# Altium schematic symbol library FPGA_Xilinx_Virtex7.SchLib: 34 symbols (part 2 of 34) (continued)
## XC7V585T-FFG1761 (continued)
part M pins: E5 MGTXRXN3_118 (io), E6 MGTXRXP3_118 (io), E9 MGTREFCLK0N_118 (io), E10 MGTREFCLK0P_118 (io), F3 MGTXTXN3_118 (io), F4 MGTXTXP3_118 (io), F7 MGTXRXN2_118 (io), F8 MGTXRXP2_118 (io), G1 MGTXTXN2_118 (io), G2 MGTXTXP2_118 (io), G5 MGTXRXN1_118 (io), G6 MGTXRXP1_118 (io), G9 MGTREFCLK1N_118 (io), G10 MGTREFCLK1P_118 (io), H3 MGTXTXN1_118 (io), H4 MGTXTXP1_118 (io), H7 MGTXRXN0_118 (io), H8 MGTXRXP0_118 (io), J1 MGTXTXN0_118 (io), J2 MGTXTXP0_118 (io), J5 MGTXRXN3_117 (io), J6 MGTXRXP3_117 (io), K3 MGTXTXN3_117 (io), K4 MGTXTXP3_117 (io), K7 MGTREFCLK0N_117 (io), K8 MGTREFCLK0P_117 (io), L1 MGTXTXN2_117 (io), L2 MGTXTXP2_117 (io), L5 MGTXRXN2_117 (io), L6 MGTXRXP2_117 (io), M3 MGTXTXN1_117 (io), M4 MGTXTXP1_117 (io), M7 MGTREFCLK1N_117 (io), M8 MGTREFCLK1P_117 (io), N1 MGTXTXN0_117 (io), N2 MGTXTXP0_117 (io), N5 MGTXRXN1_117 (io), N6 MGTXRXP1_117 (io), P7 MGTXRXN0_117 (io), P8 MGTXRXP0_117 (io)
part N pins: A5 MGTXRXN3_119 (io), A6 MGTXRXP3_119 (io), A9 MGTREFCLK0N_119 (io), A10 MGTREFCLK0P_119 (io), B3 MGTXTXN3_119 (io), B4 MGTXTXP3_119 (io), B7 MGTXRXN2_119 (io), B8 MGTXRXP2_119 (io), C1 MGTXTXN2_119 (io), C2 MGTXTXP2_119 (io), C5 MGTXRXN1_119 (io), C6 MGTXRXP1_119 (io), C9 MGTREFCLK1N_119 (io), C10 MGTREFCLK1P_119 (io), D3 MGTXTXN1_119 (io), D4 MGTXTXP1_119 (io), D7 MGTXRXN0_119 (io), D8 MGTXRXP0_119 (io), E1 MGTXTXN0_119 (io), E2 MGTXTXP0_119 (io)
part O pins: A12 MGTAVTTRCAL_115 (power), AA4 MGTAVTT_G10 (power), AA8 MGTAVCC_G10 (power), AC4 MGTAVTT_G10 (power), AC8 MGTAVCC_G10 (power), AE4 MGTAVTT_G10 (power), AE8 MGTAVCC_G10 (power), AJ4 MGTAVTT_G10 (power), AJ8 MGTAVCC_G10 (power), AL4 MGTAVTT_G10 (power), AL8 MGTAVCC_G10 (power), AM6 MGTAVTT_G10 (power), AN4 MGTAVTT_G10 (power), AN8 MGTAVCC_G10 (power), AP6 MGTAVTT_G10 (power), AR4 MGTAVTT_G10 (power), AR8 MGTAVCC_G10 (power), AU4 MGTAVTT_G10 (power), AU8 MGTAVCC_G10 (power), AV6 MGTAVTT_G10 (power), AW4 MGTAVTT_G10 (power), AW8 MGTAVCC_G10 (power), AY6 MGTAVTT_G10 (power), B6 MGTAVTT_G11 (power), B11 MGTRREF_115 (power), BA4 MGTAVTT_G10 (power), BA8 MGTAVCC_G10 (power), C4 MGTAVTT_G11 (power), C8 MGTAVCC_G11 (power), D6 MGTAVTT_G11 (power), E4 MGTAVTT_G11 (power), E8 MGTAVCC_G11 (power), F6 MGTAVTT_G11 (power), G4 MGTAVTT_G11 (power), G8 MGTAVCC_G11 (power), H6 MGTAVTT_G11 (power), J4 MGTAVTT_G11 (power), J8 MGTAVCC_G11 (power), L4 MGTAVTT_G11 (power), L8 MGTAVCC_G11 (power), N4 MGTAVTT_G11 (power), N8 MGTVCCAUX_G11 (power), P6 MGTAVTT_G11 (power), R4 MGTAVTT_G10 (power), R8 MGTVCCAUX_G10 (power), U8 MGTVCCAUX_G10 (power), W4 MGTAVTT_G10 (power), W8 MGTAVCC_G10 (power)
part P pins: AA20 VREFN_0 (io), AA21 VP_0 (io), AB20 VN_0 (io), AB21 VREFP_0 (io), AC20 DXN_0 (io), AC21 DXP_0 (io), AG11 INIT_B_0 (io), AH10 CFGBVS_0 (io), AJ10 M2_0 (io), AJ11 PROGRAM_B_0 (io), AK10 M1_0 (io), AL10 M0_0 (io), AL11 DONE_0 (io), M10 VCCO_0 (power), N10 CCLK_0 (io), P10 TCK_0 (io), P11 TMS_0 (io), R10 TDO_0 (io), T10 TDI_0 (io), T11 VCCO_0 (power)
part Q pins: A2 GND (power), A3 GND (power), A4 GND (power), A7 GND (power), A8 GND (power), A11 GND (power), A13 GND (power), A18 GND (power), A28 GND (power), A38 GND (power), AA10 VCCINT (power), AA12 VCCINT (power), AA14 VCCINT (power), AA16 VCCINT (power), AA18 VCCAUX_IO_G4 (power), AA22 VCCBRAM (power), AA24 VCCINT (power), AA26 VCCAUX (power), AA28 VCCINT (power), AB11 VCCINT (power), AB13 VCCINT (power), AB15 VCCINT (power), AB17 VCCAUX (power), AB19 VCCINT (power), AB23 VCCINT (power), AB25 VCCAUX_IO_G1 (power), AB27 VCCINT (power), AC12 VCCINT (power), AC14 VCCINT (power), AC16 VCCINT (power), AC18 VCCAUX_IO_G4 (power), AC22 VCCBRAM (power), AC24 VCCINT (power), AC26 VCCAUX (power), AC28 VCCINT (power), AD11 VCCINT (power), AD13 VCCINT (power), AD15 VCCINT (power), AD17 VCCAUX (power), AD19 VCCINT (power), AD21 VCCINT (power), AD23 VCCINT (power), AD25 VCCAUX_IO_G1 (power), AD27 VCCINT (power), AE10 VCCINT (power), AE12 VCCINT (power), AE14 VCCINT (power), AE16 VCCINT (power), AE18 VCCAUX_IO_G3 (power), AE20 VCCINT (power), AE22 VCCBRAM (power), AE24 VCCINT (power), AE26 VCCAUX (power), AE28 VCCINT (power), AF11 VCCINT (power), AF13 VCCINT (power), AF15 VCCINT (power), AF17 VCCAUX (power), AF19 VCCAUX_IO_G3 (power), AF21 VCCINT (power), AF23 VCCINT (power), AF25 VCCAUX_IO_G0 (power), AF27 VCCINT (power), AG12 VCCINT (power), AG14 VCCINT (power), AG16 VCCINT (power), AG18 VCCAUX_IO_G3 (power), AG20 VCCINT (power), AG22 VCCBRAM (power), AG24 VCCINT (power), AG26 VCCAUX (power), AG28 VCCINT (power), AH11 VCCINT (power), AH13 VCCINT (power), AH15 VCCINT (power), AH19 VCCINT (power), AH21 VCCBRAM (power), AH23 VCCINT (power), AH25 VCCAUX_IO_G0 (power), AH27 VCCINT (power), B1 GND (power), B2 GND (power), B5 GND (power), B9 GND (power), B10 GND (power), B12 GND (power), B13 GND (power), B15 GND (power), B25 GND (power), B35 GND (power), C3 GND (power), C7 GND (power), C11 GND (power), C12 GND (power), C22 GND (power), C32 GND (power), C42 GND (power), D1 GND (power), D2 GND (power), D5 GND (power), D9 GND (power), D10 GND (power), D11 GND (power), D19 GND (power), D29 GND (power), D39 GND (power), E3 GND (power), E7 GND (power), E11 GND (power), E16 GND (power), E26 GND (power), E36 GND (power), F1 GND (power), F2 GND (power), F5 GND (power), F9 GND (power), F10 GND (power), F11 GND (power), F13 GND (power), F23 GND (power), F33 GND (power), G3 GND (power), G7 GND (power), G11 GND (power), G20 GND (power), G30 GND (power), G40 GND (power), H1 GND (power), H2 GND (power), H5 GND (power), H9 GND (power), H10 GND (power), H11 GND (power), H17 GND (power), H27 GND (power), H37 GND (power), J3 GND (power), J7 GND (power), J9 GND (power), J10 GND (power), J14 GND (power), J24 GND (power), J34 GND (power), K1 GND (power), K2 GND (power), K5 GND (power), K6 GND (power), K9 GND (power), K10 GND (power), K11 GND (power), K21 GND (power), K31 GND (power), K41 GND (power), L3 GND (power), L7 GND (power), L9 GND (power), L10 GND (power), L18 GND (power), L28 GND (power), L38 GND (power), M1 GND (power), M2 GND (power), M5 GND (power), M6 GND (power), M9 GND (power), M15 GND (power), M25 GND (power), M35 GND (power), N3 GND (power), N7 GND (power), N11 VCCBATT_0 (power), P13 VCCINT (power), P15 VCCINT (power), P27 VCCINT (power), R12 VCCINT (power), R14 VCCINT (power), R16 VCCINT (power), R18 VCCAUX_IO_G5 (power), R20 VCCINT (power), R22 VCCBRAM (power), R24 VCCINT (power), R26 VCCAUX_IO_G2 (power), T13 VCCINT (power), T15 VCCINT (power), T17 VCCAUX (power), T19 VCCAUX_IO_G5 (power), T21 VCCINT (power), T23 VCCINT (power), T25 VCCAUX_IO_G2 (power), T27 VCCINT (power), U12 VCCINT (power), U14 VCCINT (power), U16 VCCINT (power), U18 VCCAUX_IO_G5 (power), U20 VCCINT (power), U22 VCCBRAM (power), U24 VCCINT (power), U26 VCCAUX (power), V11 VCCINT (power), V13 VCCINT (power), V15 VCCINT (power), V17 VCCAUX (power), V19 VCCINT (power), V21 VCCINT (power), V23 VCCINT (power), V25 VCCAUX_IO_G2 (power), V27 VCCINT (power), W12 VCCINT (power), W14 VCCINT (power), W16 VCCINT (power), W18 VCCAUX_IO_G4 (power), W20 VCCINT (power), W22 VCCBRAM (power), W24 VCCINT (power), W26 VCCAUX (power), W28 VCCINT (power), Y11 VCCINT (power), Y13 VCCINT (power), Y15 VCCINT (power), Y17 VCCAUX (power), Y19 VCCINT (power), Y20 GNDADC_0 (power), Y21 VCCADC_0 (power), Y23 VCCINT (power), Y25 VCCAUX_IO_G1 (power), Y27 VCCINT (power)
part R pins: AA3 GND (power), AA7 GND (power), AA9 GND (power), AA11 GND (power), AA13 GND (power), AA15 GND (power), AA17 GND (power), AA19 GND (power), AA23 GND (power), AA25 GND (power), AA27 GND (power), AA38 GND (power), AB1 GND (power), AB2 GND (power), AB5 GND (power), AB6 GND (power), AB9 GND (power), AB10 GND (power), AB12 GND (power), AB14 GND (power), AB16 GND (power), AB18 GND (power), AB22 GND (power), AB24 GND (power), AB26 GND (power), AB28 GND (power), AB35 GND (power), AC3 GND (power), AC7 GND (power), AC11 GND (power), AC13 GND (power), AC15 GND (power), AC17 GND (power), AC19 GND (power), AC23 GND (power), AC25 GND (power), AC27 GND (power), AC32 GND (power), AC42 GND (power), AD1 GND (power), AD2 GND (power), AD5 GND (power), AD6 GND (power), AD9 GND (power), AD10 GND (power), AD12 GND (power), AD14 GND (power), AD16 GND (power), AD18 GND (power), AD20 GND (power), AD22 GND (power), AD24 GND (power), AD26 GND (power), AD28 GND (power), AD29 GND (power), AD39 GND (power), AE3 GND (power), AE7 GND (power), AE9 GND (power), AE11 GND (power), AE13 GND (power), AE15 GND (power), AE17 GND (power), AE19 GND (power), AE21 GND (power), AE23 GND (power), AE25 GND (power), AE27 GND (power), AE36 GND (power), AF1 GND (power), AF2 GND (power), AF5 GND (power), AF6 GND (power), AF9 GND (power), AF10 GND (power), AF12 GND (power), AF14 GND (power), AF16 GND (power), AF18 GND (power), AF20 GND (power), AF22 GND (power), AF24 GND (power), AF26 GND (power), AF33 GND (power), AG3 GND (power), AG4 GND (power), AG7 GND (power), AG8 GND (power), AG9 GND (power), AG10 GND (power), AG13 GND (power), AG15 GND (power), AG17 GND (power), AG19 GND (power), AG21 GND (power), AG23 GND (power), AG25 GND (power), AG27 GND (power), AG30 GND (power), AG40 GND (power), AH1 GND (power), AH2 GND (power), AH5 GND (power), AH6 GND (power), AH9 GND (power), AH12 GND (power), AH14 GND (power), AH16 GND (power), AH17 GND (power), AH18 GND (power), AH20 GND (power), AH22 GND (power), AH24 GND (power), AH26 GND (power), AH37 GND (power), AJ3 GND (power), AJ7 GND (power), AJ9 GND (power), AJ14 GND (power), AJ24 GND (power), AJ27 GND (power), AJ34 GND (power), AK1 GND (power), AK2 GND (power), AK5 GND (power), AK6 GND (power), AK9 GND (power), AK11 GND (power), AK21 GND (power), AK31 GND (power), AK41 GND (power), AL3 GND (power), AL7 GND (power), AL9 GND (power), AL18 GND (power), AL28 GND (power), AL38 GND (power), AM1 GND (power), AM2 GND (power), AM5 GND (power), AM9 GND (power), AM10 GND (power), AM15 GND (power), AM25 GND (power), AM35 GND (power), AN3 GND (power), AN7 GND (power), AN9 GND (power), AN10 GND (power), AN12 GND (power), AN22 GND (power), AN32 GND (power), AN42 GND (power), AP1 GND (power), AP2 GND (power), AP5 GND (power), AP9 GND (power), AP10 GND (power), AP19 GND (power), AP29 GND (power), AP39 GND (power), AR3 GND (power), AR7 GND (power), AR9 GND (power), AR10 GND (power), AR16 GND (power), AR26 GND (power), AR36 GND (power), AT1 GND (power), AT2 GND (power), AT5 GND (power), AT6 GND (power), AT9 GND (power), AT10 GND (power), AT11 GND (power), AT13 GND (power), AT23 GND (power), AT33 GND (power), AU3 GND (power), AU7 GND (power), AU11 GND (power), AU20 GND (power), AU30 GND (power), AU40 GND (power), AV1 GND (power), AV2 GND (power), AV5 GND (power), AV9 GND (power), AV10 GND (power), AV11 GND (power), AV17 GND (power), AV27 GND (power), AV37 GND (power), AW3 GND (power), AW7 GND (power), AW11 GND (power), AW14 GND (power), AW24 GND (power), AW34 GND (power), AY1 GND (power), AY2 GND (power), N9 GND (power), N12 GND (power), N22 GND (power), N32 GND (power), N42 GND (power), P1 GND (power), P2 GND (power), P5 GND (power), P9 GND (power), P12 GND (power), P16 GND (power), P19 GND (power), P29 GND (power), P39 GND (power), R3 GND (power), R7 GND (power), R9 GND (power), R11 GND (power), R13 GND (power), R15 GND (power), R17 GND (power), R19 GND (power), R21 GND (power), R23 GND (power), R25 GND (power), R27 GND (power), R36 GND (power), T1 GND (power), T2 GND (power), T5 GND (power), T6 GND (power), T9 GND (power), T12 GND (power), T14 GND (power), T16 GND (power), T18 GND (power), T20 GND (power), T22 GND (power), T24 GND (power), T26 GND (power), T33 GND (power), U3 GND (power), U4 GND (power), U7 GND (power), U9 GND (power), U10 GND (power), U11 GND (power), U13 GND (power), U15 GND (power), U17 GND (power), U19 GND (power), U21 GND (power), U23 GND (power), U25 GND (power), U27 GND (power), U30 GND (power), U40 GND (power), V1 GND (power), V2 GND (power), V5 GND (power), V6 GND (power), V9 GND (power), V10 GND (power), V12 GND (power), V14 GND (power), V16 GND (power), V18 GND (power), V20 GND (power), V22 GND (power), V24 GND (power), V26 GND (power), V28 GND (power), V37 GND (power), W3 GND (power), W7 GND (power), W11 GND (power), W13 GND (power), W15 GND (power), W17 GND (power), W19 GND (power), W21 GND (power), W23 GND (power), W25 GND (power), W27 GND (power), W34 GND (power), Y1 GND (power), Y2 GND (power), Y5 GND (power), Y6 GND (power), Y9 GND (power), Y10 GND (power), Y12 GND (power), Y14 GND (power), Y16 GND (power), Y18 GND (power), Y22 GND (power), Y24 GND (power), Y26 GND (power), Y28 GND (power), Y31 GND (power), Y41 GND (power)
part S pins: AY5 GND (power), AY9 GND (power), AY10 GND (power), AY11 GND (power), AY21 GND (power), AY31 GND (power), AY41 GND (power), BA3 GND (power), BA7 GND (power), BA11 GND (power), BA18 GND (power), BA28 GND (power), BA38 GND (power), BB2 GND (power), BB5 GND (power), BB6 GND (power), BB9 GND (power), BB10 GND (power), BB11 GND (power), BB15 GND (power), BB25 GND (power), BB35 GND (power)

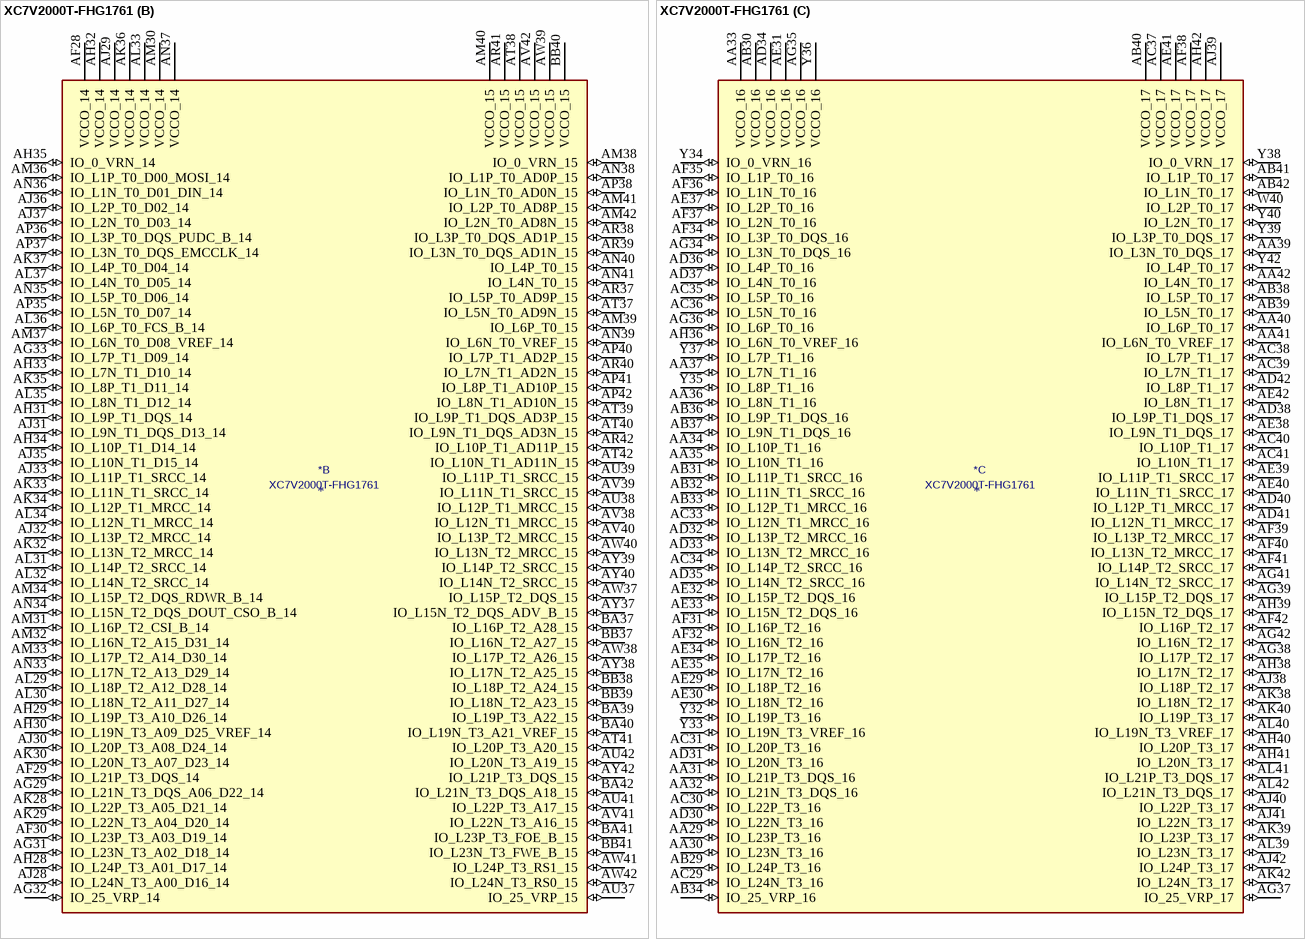
[diagram p11: symbol XC7V2000T-FHG1761]

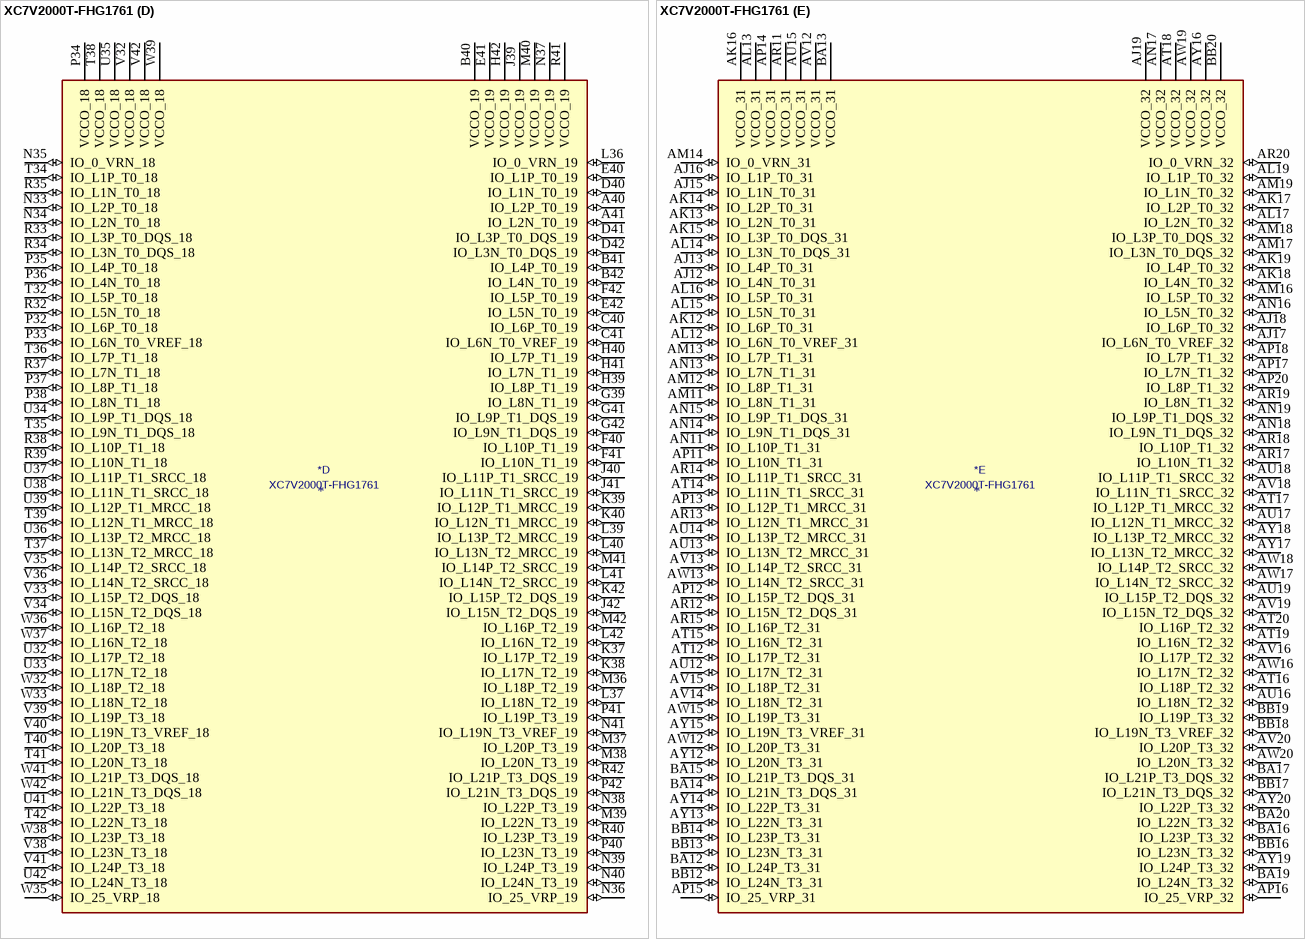
[diagram p12: symbol XC7V2000T-FHG1761]

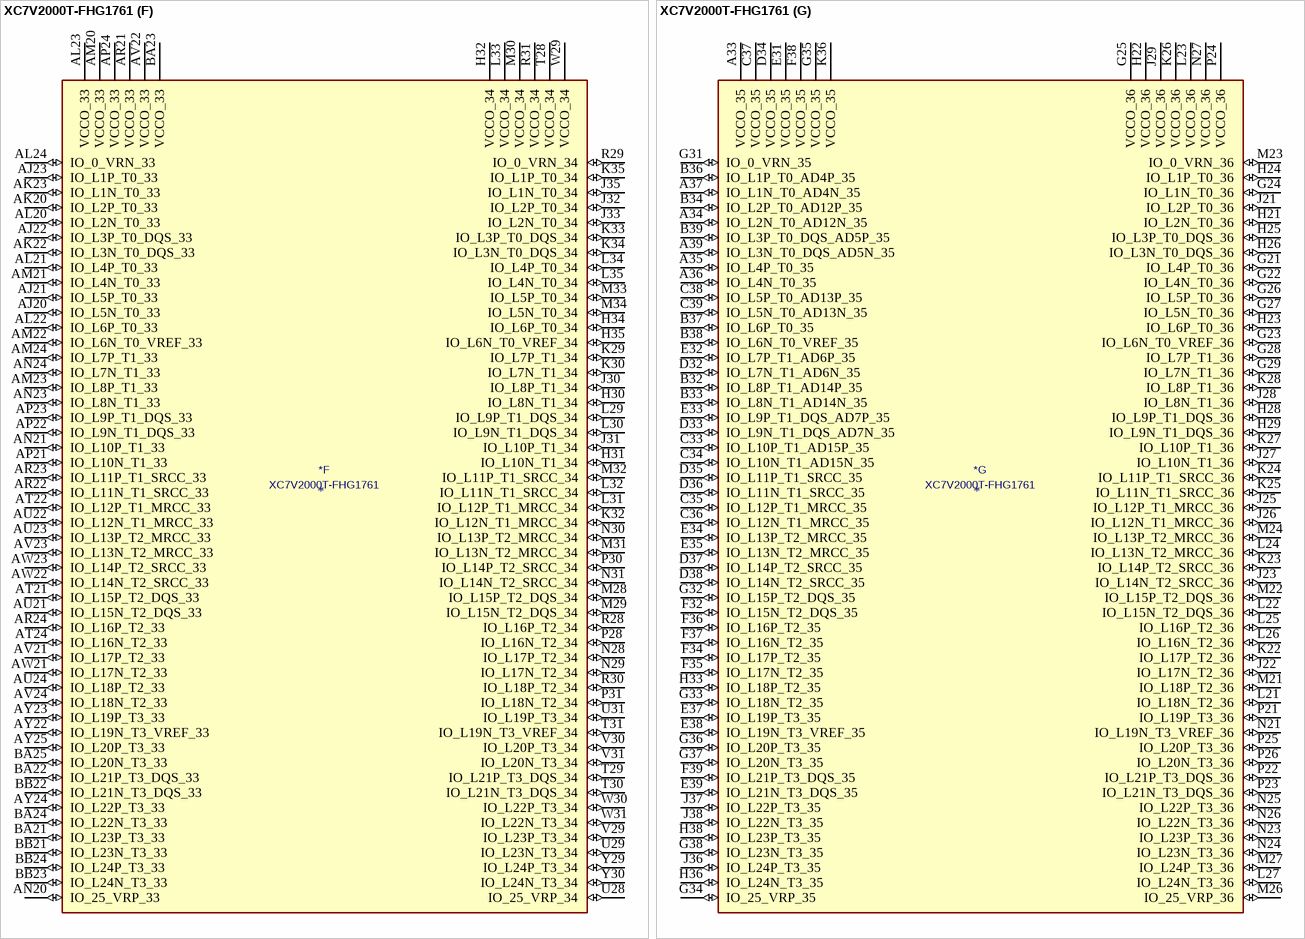
[diagram p13: symbol XC7V2000T-FHG1761]

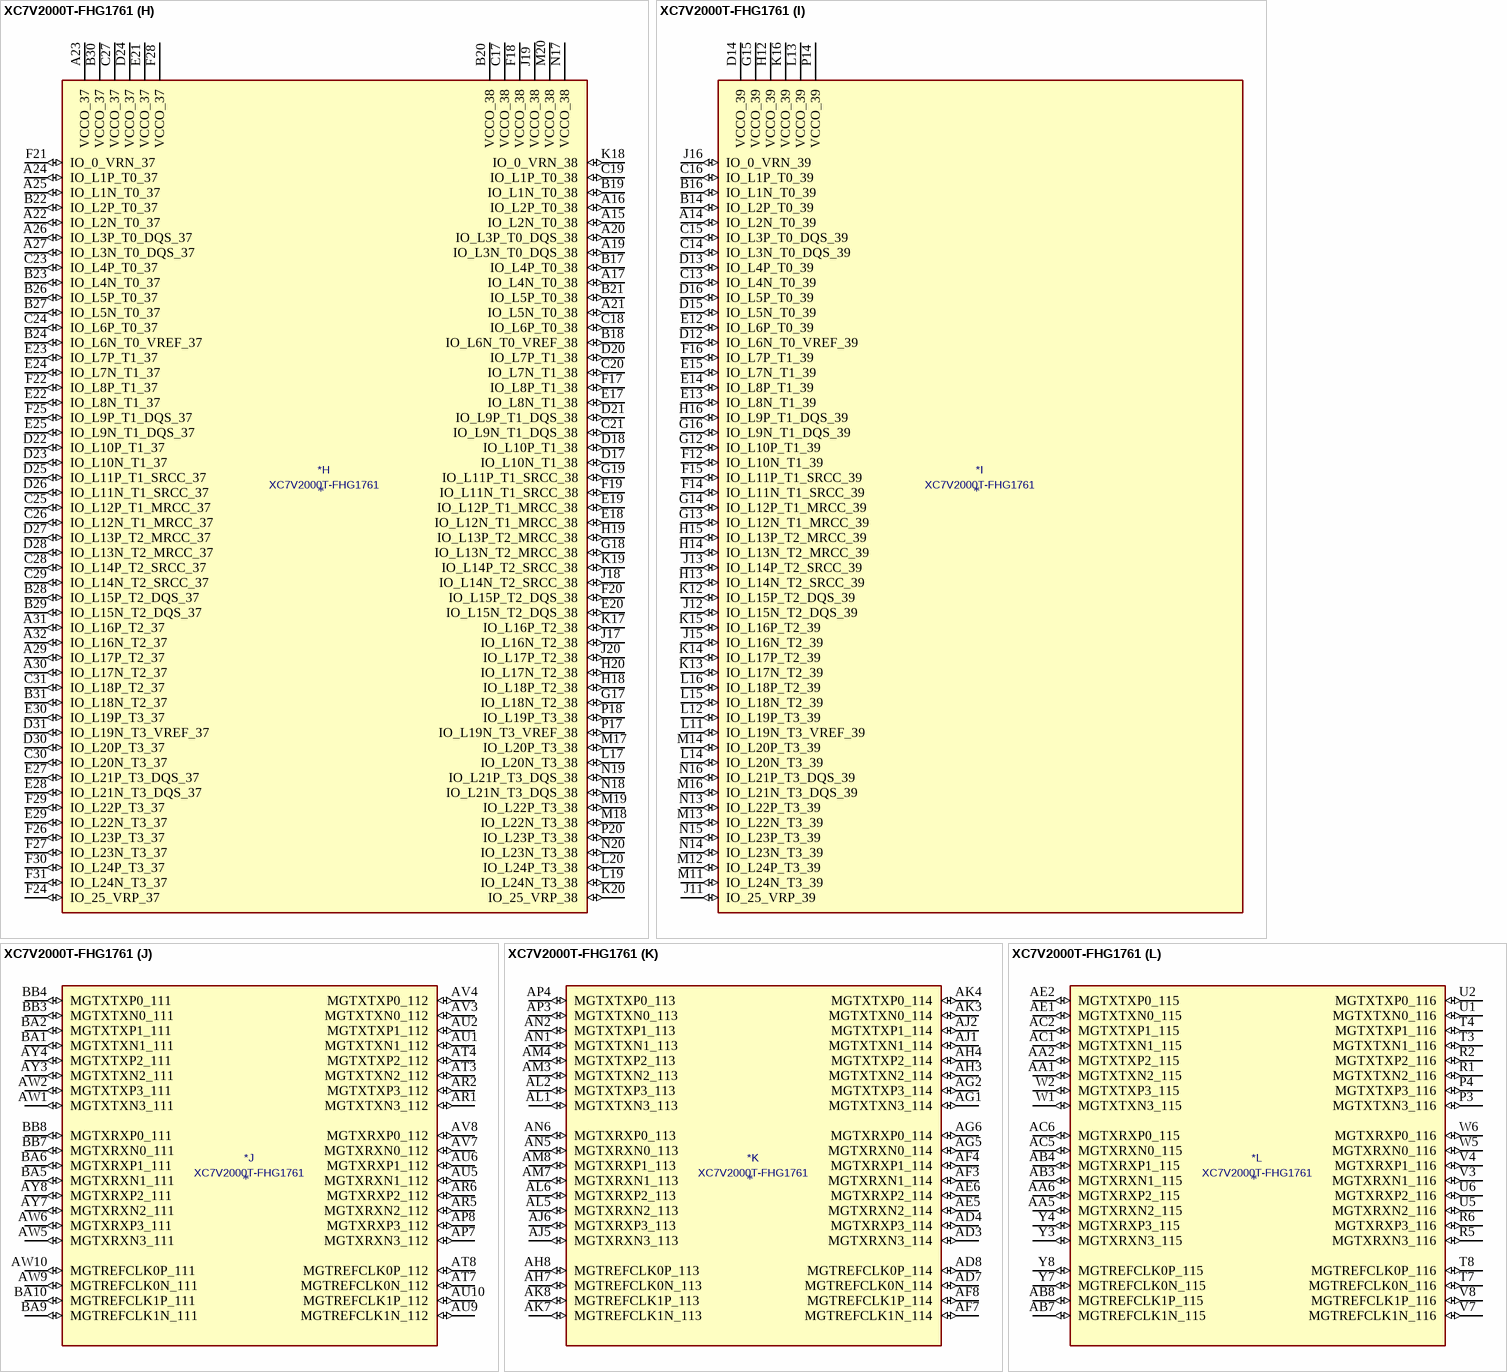
[diagram p14: symbol XC7V2000T-FHG1761]

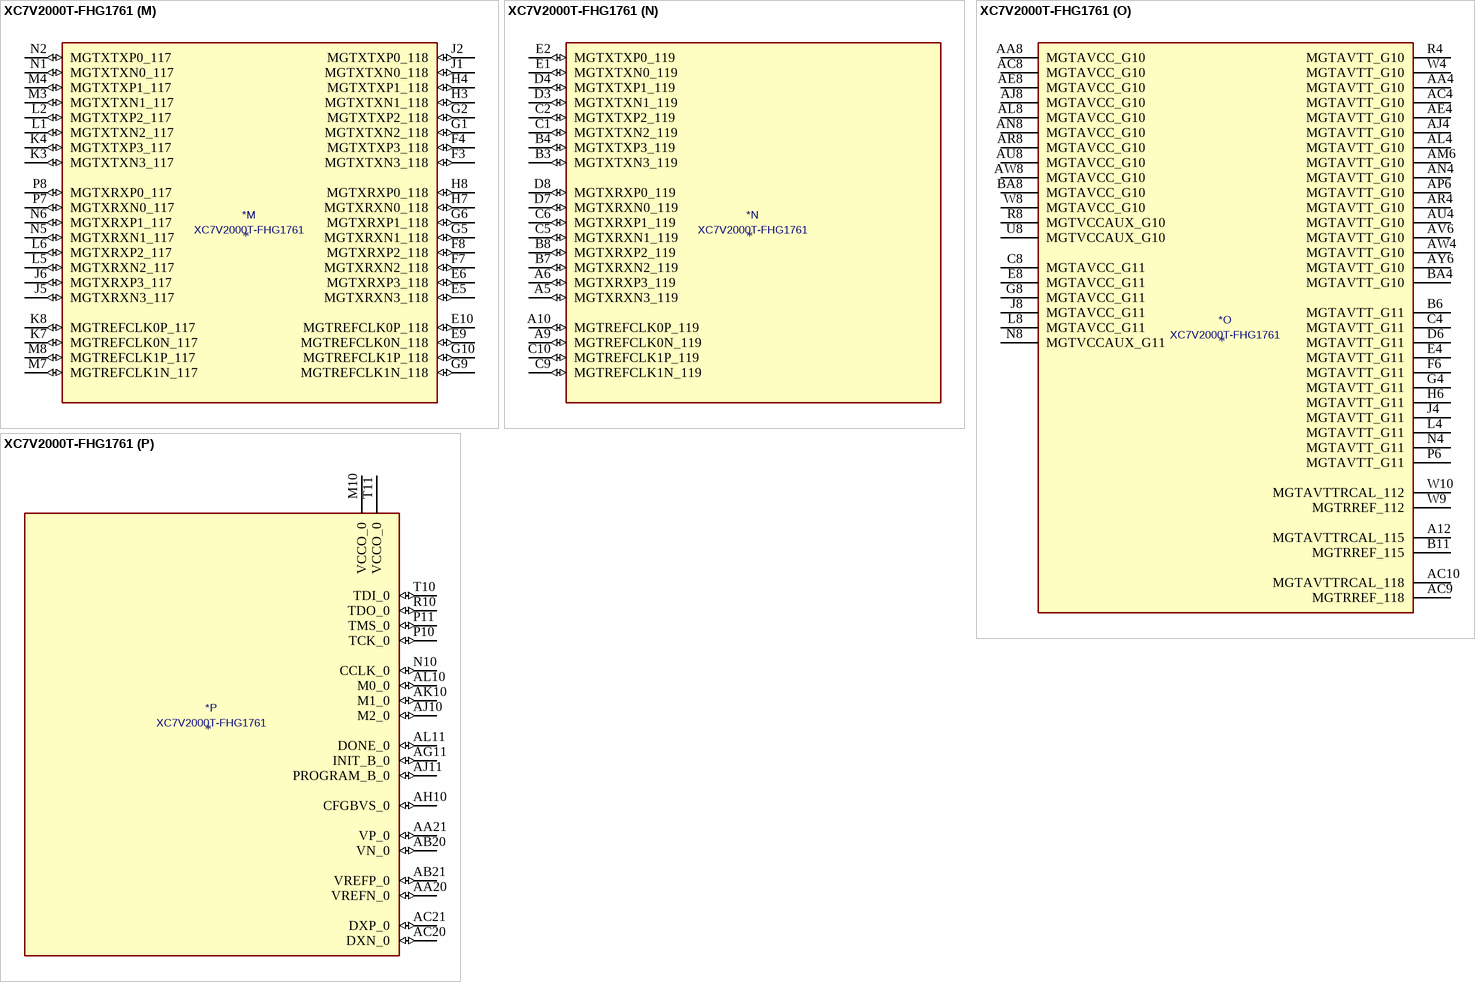
[diagram p15: symbol XC7V2000T-FHG1761]

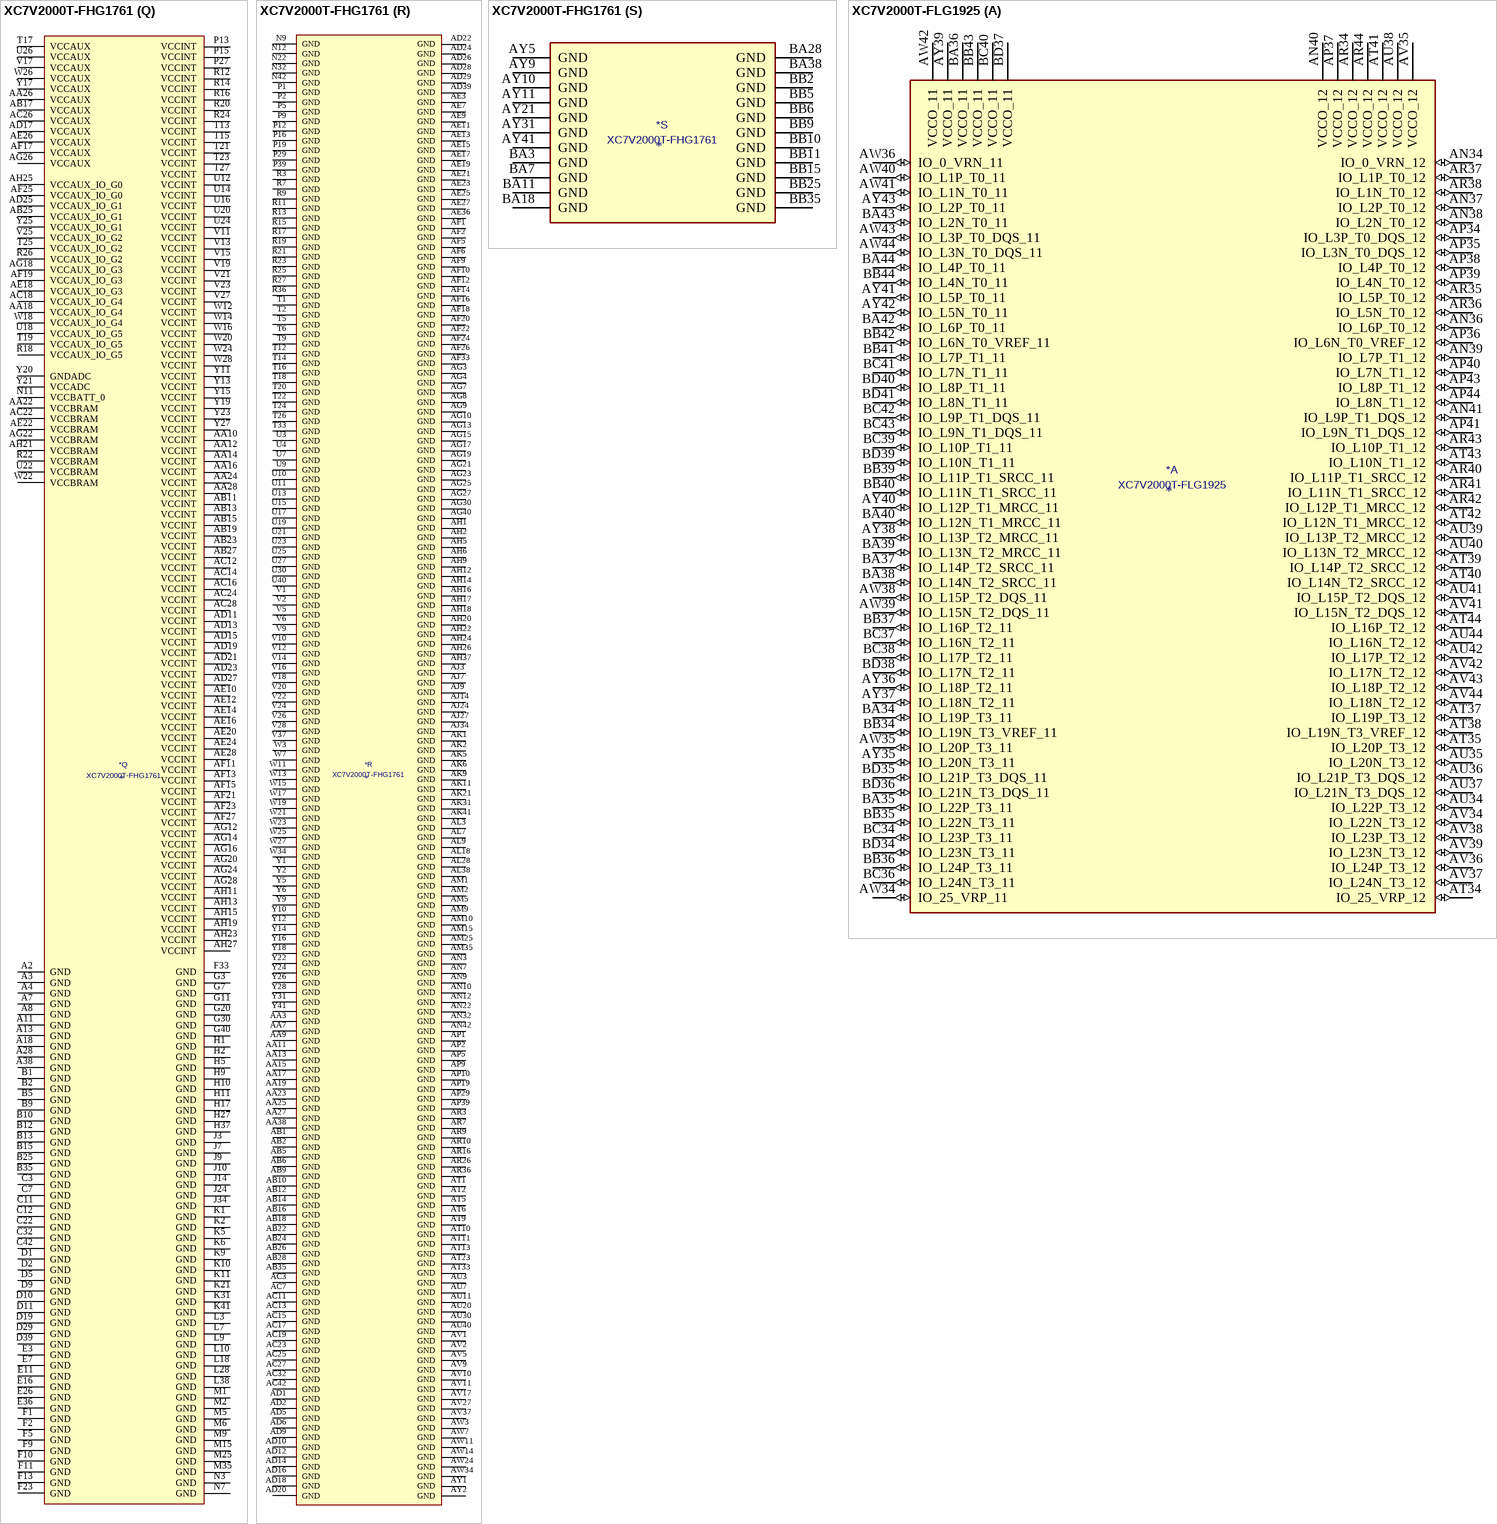
[diagram p16: symbols XC7V2000T-FHG1761 to XC7V2000T-FLG1925]